# Altium footprint library SAMTEC SMD.PcbLib: 165 footprints (part 15 of 17)
Each footprint in its own frame and in the unit in brackets; x right, y up, seen from the top. Pads: shape width x height; smd on the part's side, far side on the other; paste and mask are expansions set on the pad; w line width, h text height; cw(c..) or ccw(c..) is an arc to the next point about the centre after c.
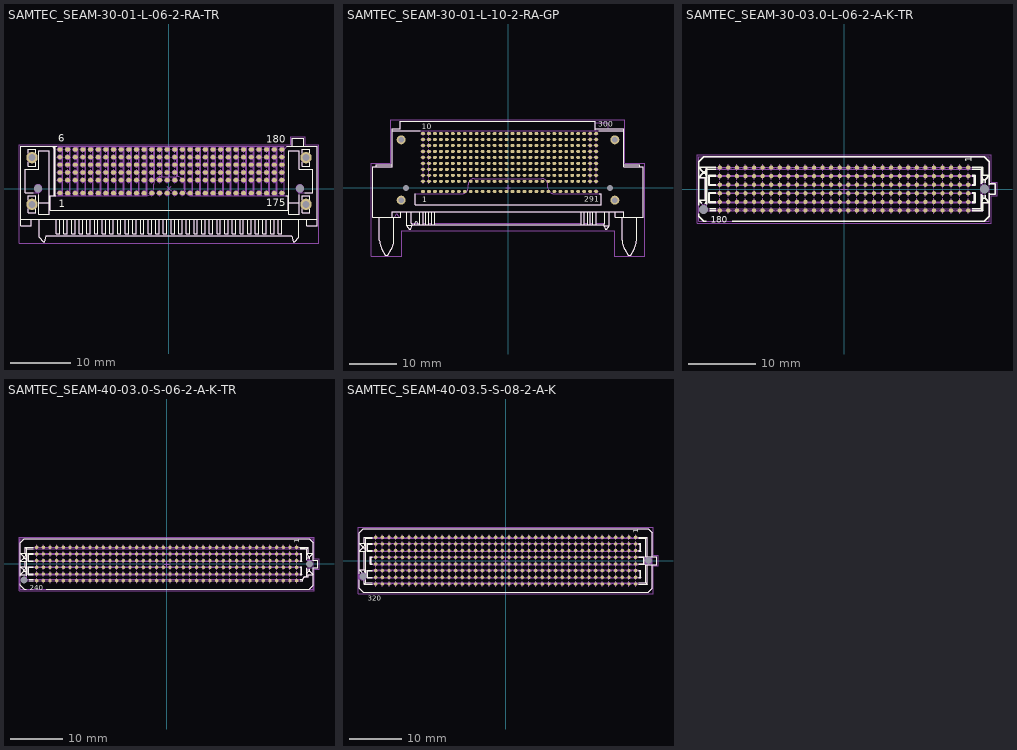
[diagram p14: the footprints below, top view; thin cyan lines are the x and y axes]

## SAMTEC_SEAM-30-01-L-06-2-RA-TR [mm] "180 Contacts in 6 rows  (30 Pin per Row), Hi-Density Right Angle Open Pin Field Connector"
height 10.59
pads (186):
  rrect100% 0.84x0.64 smd paste+0.1: 1(-18.085,-0.762) 2(-18.085,1.397) 3(-18.085,2.667) 4(-18.085,3.937) 5(-18.085,5.207) 6(-18.085,6.477) 7(-16.815,-0.762) 8(-16.815,1.397) 9(-16.815,2.667) 10(-16.815,3.937) 11(-16.815,5.207) 12(-16.815,6.477) 13(-15.545,-0.762) 14(-15.545,1.397) 15(-15.545,2.667) 16(-15.545,3.937) 17(-15.545,5.207) 18(-15.545,6.477) 19(-14.275,-0.762) 20(-14.275,1.397) 21(-14.275,2.667) 22(-14.275,3.937) 23(-14.275,5.207) 24(-14.275,6.477) 25(-13.005,-0.762) 26(-13.005,1.397) 27(-13.005,2.667) 28(-13.005,3.937) 29(-13.005,5.207) 30(-13.005,6.477) 31(-11.735,-0.762) 32(-11.735,1.397) 33(-11.735,2.667) 34(-11.735,3.937) 35(-11.735,5.207) 36(-11.735,6.477) 37(-10.465,-0.762) 38(-10.465,1.397) 39(-10.465,2.667) 40(-10.465,3.937) 41(-10.465,5.207) 42(-10.465,6.477) 43(-9.195,-0.762) 44(-9.195,1.397) 45(-9.195,2.667) 46(-9.195,3.937) 47(-9.195,5.207) 48(-9.195,6.477) 49(-7.925,-0.762) 50(-7.925,1.397) 51(-7.925,2.667) 52(-7.925,3.937) 53(-7.925,5.207) 54(-7.925,6.477) 55(-6.655,-0.762) 56(-6.655,1.397) 57(-6.655,2.667) 58(-6.655,3.937) 59(-6.655,5.207) 60(-6.655,6.477) 61(-5.385,-0.762) 62(-5.385,1.397) 63(-5.385,2.667) 64(-5.385,3.937) 65(-5.385,5.207) 66(-5.385,6.477) 67(-4.115,-0.762) 68(-4.115,1.397) 69(-4.115,2.667) 70(-4.115,3.937) 71(-4.115,5.207) 72(-4.115,6.477) 73(-2.845,-0.762) 74(-2.845,1.397) 75(-2.845,2.667) 76(-2.845,3.937) 77(-2.845,5.207) 78(-2.845,6.477) 79(-1.575,-0.762) 80(-1.575,1.397) 81(-1.575,2.667) 82(-1.575,3.937) 83(-1.575,5.207) 84(-1.575,6.477) 85(-0.305,-0.762) 86(-0.305,1.397) 87(-0.305,2.667) 88(-0.305,3.937) 89(-0.305,5.207) 90(-0.305,6.477) 91(0.965,-0.762) 92(0.965,1.397) 93(0.965,2.667) 94(0.965,3.937) 95(0.965,5.207) 96(0.965,6.477) 97(2.235,-0.762) 98(2.235,1.397) 99(2.235,2.667) 100(2.235,3.937) 101(2.235,5.207) 102(2.235,6.477) 103(3.505,-0.762) 104(3.505,1.397) 105(3.505,2.667) 106(3.505,3.937) 107(3.505,5.207) 108(3.505,6.477) 109(4.775,-0.762) 110(4.775,1.397) 111(4.775,2.667) 112(4.775,3.937) 113(4.775,5.207) 114(4.775,6.477) 115(6.045,-0.762) 116(6.045,1.397) 117(6.045,2.667) 118(6.045,3.937) 119(6.045,5.207) 120(6.045,6.477) 121(7.315,-0.762) 122(7.315,1.397) 123(7.315,2.667) 124(7.315,3.937) 125(7.315,5.207) 126(7.315,6.477) 127(8.585,-0.762) 128(8.585,1.397) 129(8.585,2.667) 130(8.585,3.937) 131(8.585,5.207) 132(8.585,6.477) 133(9.855,-0.762) 134(9.855,1.397) 135(9.855,2.667) 136(9.855,3.937) 137(9.855,5.207) 138(9.855,6.477) 139(11.125,-0.762) 140(11.125,1.397) 141(11.125,2.667) 142(11.125,3.937) 143(11.125,5.207) 144(11.125,6.477) 145(12.395,-0.762) 146(12.395,1.397) 147(12.395,2.667) 148(12.395,3.937) 149(12.395,5.207) 150(12.395,6.477) 151(13.665,-0.762) 152(13.665,1.397) 153(13.665,2.667) 154(13.665,3.937) 155(13.665,5.207) 156(13.665,6.477) 157(14.935,-0.762) 158(14.935,1.397) 159(14.935,2.667) 160(14.935,3.937) 161(14.935,5.207) 162(14.935,6.477) 163(16.205,-0.762) 164(16.205,1.397) 165(16.205,2.667) 166(16.205,3.937) 167(16.205,5.207) 168(16.205,6.477) 169(17.475,-0.762) 170(17.475,1.397) 171(17.475,2.667) 172(17.475,3.937) 173(17.475,5.207) 174(17.475,6.477) 175(18.745,-0.762) 176(18.745,1.397) 177(18.745,2.667) 178(18.745,3.937) 179(18.745,5.207) 180(18.745,6.477)
  round 0.5 hole 1.3 unplated mask+0.4: MEC1(-21.715,0) MEC2(21.715,0)
  round 1.9 hole 1.15 unplated mask+0.075: MEC3(-22.735,5.134) MEC4(-22.735,-2.616) MEC5(22.735,5.134) MEC6(22.735,-2.616)
Top Overlay:
  drawing of 197 lines, arcs and shapes, not listed
  text "6" at -18.353,7.72 h1.2
  text "180" at 16.177,7.62 h1.2
  text "175" at 16.177,-2.98 h1.2
  text "1" at -18.253,-3.08 h1.2
Mechanical 8:
  drawing of 1656 lines, arcs and shapes, not listed
Mechanical 14:
  drawing of 286 lines, arcs and shapes, not listed
  text "6" at -18.353,7.72 h1.2
  text "180" at 16.177,7.62 h1.2
  text "175" at 16.177,-2.98 h1.2
  text "1" at -18.253,-3.08 h1.2
Mechanical 15:
  lines w0.05: -24.888,-9.077 24.888,-9.077 24.888,7.298 22.529,7.298 22.484,8.568 20.238,8.568 20.194,7.298 -24.888,7.298 -24.888,-9.077
3D body "SAMTEC_SEAM-30-01-L-06-2-RA-TR.stp": height 10.57, standoff -1.51, extent -24.638,-8.826 24.638,8.319

## SAMTEC_SEAM-30-01-L-10-2-RA-GP [mm] "300 contacts (10 rows x 30 Columns) Hi-Density Right Angle Open Pin Field Connector with Guide Post Holes"
height 15.53
pads (306):
  rrect100% 0.84x0.64 smd paste+0.1: 1(-18.085,-0.762) 2(-18.085,1.397) 3(-18.085,2.667) 4(-18.085,3.937) 5(-18.085,5.207) 6(-18.085,6.477) 7(-18.085,7.747) 8(-18.085,9.017) 9(-18.085,10.287) 10(-18.085,11.557) 11(-16.815,-0.762) 12(-16.815,1.397) 13(-16.815,2.667) 14(-16.815,3.937) 15(-16.815,5.207) 16(-16.815,6.477) 17(-16.815,7.747) 18(-16.815,9.017) 19(-16.815,10.287) 20(-16.815,11.557) 21(-15.545,-0.762) 22(-15.545,1.397) 23(-15.545,2.667) 24(-15.545,3.937) 25(-15.545,5.207) 26(-15.545,6.477) 27(-15.545,7.747) 28(-15.545,9.017) 29(-15.545,10.287) 30(-15.545,11.557) 31(-14.275,-0.762) 32(-14.275,1.397) 33(-14.275,2.667) 34(-14.275,3.937) 35(-14.275,5.207) 36(-14.275,6.477) 37(-14.275,7.747) 38(-14.275,9.017) 39(-14.275,10.287) 40(-14.275,11.557) 41(-13.005,-0.762) 42(-13.005,1.397) 43(-13.005,2.667) 44(-13.005,3.937) 45(-13.005,5.207) 46(-13.005,6.477) 47(-13.005,7.747) 48(-13.005,9.017) 49(-13.005,10.287) 50(-13.005,11.557) 51(-11.735,-0.762) 52(-11.735,1.397) 53(-11.735,2.667) 54(-11.735,3.937) 55(-11.735,5.207) 56(-11.735,6.477) 57(-11.735,7.747) 58(-11.735,9.017) 59(-11.735,10.287) 60(-11.735,11.557) 61(-10.465,-0.762) 62(-10.465,1.397) 63(-10.465,2.667) 64(-10.465,3.937) 65(-10.465,5.207) 66(-10.465,6.477) 67(-10.465,7.747) 68(-10.465,9.017) 69(-10.465,10.287) 70(-10.465,11.557) 71(-9.195,-0.762) 72(-9.195,1.397) 73(-9.195,2.667) 74(-9.195,3.937) 75(-9.195,5.207) 76(-9.195,6.477) 77(-9.195,7.747) 78(-9.195,9.017) 79(-9.195,10.287) 80(-9.195,11.557) 81(-7.925,-0.762) 82(-7.925,1.397) 83(-7.925,2.667) 84(-7.925,3.937) 85(-7.925,5.207) 86(-7.925,6.477) 87(-7.925,7.747) 88(-7.925,9.017) 89(-7.925,10.287) 90(-7.925,11.557) 91(-6.655,-0.762) 92(-6.655,1.397) 93(-6.655,2.667) 94(-6.655,3.937) 95(-6.655,5.207) 96(-6.655,6.477) 97(-6.655,7.747) 98(-6.655,9.017) 99(-6.655,10.287) 100(-6.655,11.557) 101(-5.385,-0.762) 102(-5.385,1.397) 103(-5.385,2.667) 104(-5.385,3.937) 105(-5.385,5.207) 106(-5.385,6.477) 107(-5.385,7.747) 108(-5.385,9.017) 109(-5.385,10.287) 110(-5.385,11.557) 111(-4.115,-0.762) 112(-4.115,1.397) 113(-4.115,2.667) 114(-4.115,3.937) 115(-4.115,5.207) 116(-4.115,6.477) 117(-4.115,7.747) 118(-4.115,9.017) 119(-4.115,10.287) 120(-4.115,11.557) 121(-2.845,-0.762) 122(-2.845,1.397) 123(-2.845,2.667) 124(-2.845,3.937) 125(-2.845,5.207) 126(-2.845,6.477) 127(-2.845,7.747) 128(-2.845,9.017) 129(-2.845,10.287) 130(-2.845,11.557) 131(-1.575,-0.762) 132(-1.575,1.397) 133(-1.575,2.667) 134(-1.575,3.937) 135(-1.575,5.207) 136(-1.575,6.477) 137(-1.575,7.747) 138(-1.575,9.017) 139(-1.575,10.287) 140(-1.575,11.557) 141(-0.305,-0.762) 142(-0.305,1.397) 143(-0.305,2.667) 144(-0.305,3.937) 145(-0.305,5.207) 146(-0.305,6.477) 147(-0.305,7.747) 148(-0.305,9.017) 149(-0.305,10.287) 150(-0.305,11.557) 151(0.965,-0.762) 152(0.965,1.397) 153(0.965,2.667) 154(0.965,3.937) 155(0.965,5.207) 156(0.965,6.477) 157(0.965,7.747) 158(0.965,9.017) 159(0.965,10.287) 160(0.965,11.557) 161(2.235,-0.762) 162(2.235,1.397) 163(2.235,2.667) 164(2.235,3.937) 165(2.235,5.207) 166(2.235,6.477) 167(2.235,7.747) 168(2.235,9.017) 169(2.235,10.287) 170(2.235,11.557) 171(3.505,-0.762) 172(3.505,1.397) 173(3.505,2.667) 174(3.505,3.937) 175(3.505,5.207) 176(3.505,6.477) 177(3.505,7.747) 178(3.505,9.017) 179(3.505,10.287) 180(3.505,11.557) 181(4.775,-0.762) 182(4.775,1.397) 183(4.775,2.667) 184(4.775,3.937) 185(4.775,5.207) 186(4.775,6.477) 187(4.775,7.747) 188(4.775,9.017) 189(4.775,10.287) 190(4.775,11.557) 191(6.045,-0.762) 192(6.045,1.397) 193(6.045,2.667) 194(6.045,3.937) 195(6.045,5.207) 196(6.045,6.477) 197(6.045,7.747) 198(6.045,9.017) 199(6.045,10.287) 200(6.045,11.557) 201(7.315,-0.762) 202(7.315,1.397) 203(7.315,2.667) 204(7.315,3.937) 205(7.315,5.207) 206(7.315,6.477) 207(7.315,7.747) 208(7.315,9.017) 209(7.315,10.287) 210(7.315,11.557) 211(8.585,-0.762) 212(8.585,1.397) 213(8.585,2.667) 214(8.585,3.937) 215(8.585,5.207) 216(8.585,6.477) 217(8.585,7.747) 218(8.585,9.017) 219(8.585,10.287) 220(8.585,11.557) 221(9.855,-0.762) 222(9.855,1.397) 223(9.855,2.667) 224(9.855,3.937) 225(9.855,5.207) 226(9.855,6.477) 227(9.855,7.747) 228(9.855,9.017) 229(9.855,10.287) 230(9.855,11.557) 231(11.125,-0.762) 232(11.125,1.397) 233(11.125,2.667) 234(11.125,3.937) 235(11.125,5.207) 236(11.125,6.477) 237(11.125,7.747) 238(11.125,9.017) 239(11.125,10.287) 240(11.125,11.557) 241(12.395,-0.762) 242(12.395,1.397) 243(12.395,2.667) 244(12.395,3.937) 245(12.395,5.207) 246(12.395,6.477) 247(12.395,7.747) 248(12.395,9.017) 249(12.395,10.287) 250(12.395,11.557) 251(13.665,-0.762) 252(13.665,1.397) 253(13.665,2.667) 254(13.665,3.937) 255(13.665,5.207) 256(13.665,6.477) 257(13.665,7.747) 258(13.665,9.017) 259(13.665,10.287) 260(13.665,11.557) 261(14.935,-0.762) 262(14.935,1.397) 263(14.935,2.667) 264(14.935,3.937) 265(14.935,5.207) 266(14.935,6.477) 267(14.935,7.747) 268(14.935,9.017) 269(14.935,10.287) 270(14.935,11.557) 271(16.205,-0.762) 272(16.205,1.397) 273(16.205,2.667) 274(16.205,3.937) 275(16.205,5.207) 276(16.205,6.477) 277(16.205,7.747) 278(16.205,9.017) 279(16.205,10.287) 280(16.205,11.557) 281(17.475,-0.762) 282(17.475,1.397) 283(17.475,2.667) 284(17.475,3.937) 285(17.475,5.207) 286(17.475,6.477) 287(17.475,7.747) 288(17.475,9.017) 289(17.475,10.287) 290(17.475,11.557) 291(18.745,-0.762) 292(18.745,1.397) 293(18.745,2.667) 294(18.745,3.937) 295(18.745,5.207) 296(18.745,6.477) 297(18.745,7.747) 298(18.745,9.017) 299(18.745,10.287) 300(18.745,11.557)
  round 0.5 hole 1.3 unplated mask+0.4: MEC1(-21.715,0) MEC2(21.715,0)
  round 1.9 hole 1.15 unplated mask+0.075: MEC3(-22.735,10.214) MEC4(-22.735,-2.616) MEC5(22.735,10.214) MEC6(22.735,-2.616)
Top Overlay:
  lines w0.2: -28.003,4.496 -28.003,4.953 -24.638,4.953 ; -27.343,-6.223 -27.343,-11.129 ccw(c-23.533,-11.129) -26.833,-13.033 ; -26.833,-13.033 -26.073,-14.351 -25.565,-14.351 -24.805,-13.033 ; -24.805,-13.033 ccw(c-28.105,-11.129) -24.295,-11.129 -24.295,-6.223 ; -24.638,-6.223 -24.638,-5.08 24.638,-5.08 24.638,-6.223 ; -24.638,12.116 -18.657,12.116 ; -22.86,-5.08 -22.86,-6.223 -28.829,-6.223 -28.829,4.496 -24.638,4.496 -24.638,12.624 -22.911,12.624 -22.911,14.199 18.517,14.199 18.517,12.324 ; -21.539,-7.968 -20.352,-7.968 -20.669,-8.839 -21.006,-8.839 -21.539,-8.077 -21.539,-5.08 ; -20.599,-5.08 -20.599,-7.569 -20.345,-7.823 ; -20.345,-7.95 -20.345,-7.823 ; -19.95,-7.823 -19.5,-7.123 -19.05,-7.823 ; -19.685,-1.219 -19.685,-3.632 19.812,-3.632 19.812,-1.219 19.401,-1.219 ; -18.745,-7.823 -18.745,-5.08 ; -18.085,-7.823 -18.085,-5.08 ; -17.475,-7.823 -17.475,-5.08 ; -16.815,-7.823 -16.815,-5.08 ; -16.205,-7.823 -16.205,-5.08 ; -15.545,-7.823 -15.545,-5.08 ; 15.545,-7.823 15.545,-5.08 ; 16.205,-7.823 16.205,-5.08 ; 16.815,-7.823 16.815,-5.08 ; 17.475,-7.823 17.475,-5.08 ; 18.085,-7.823 18.085,-5.08 ; 18.517,12.548 24.638,12.548 24.638,4.496 28.829,4.496 28.829,-6.223 22.86,-6.223 22.86,-5.08 ; 18.745,-7.823 18.745,-5.08 ; 19.317,12.116 24.638,12.116 ; 20.392,-8.077 21.539,-8.077 ; 20.599,-5.08 20.599,-7.569 20.345,-7.823 ; 21.539,-5.08 21.539,-8.077 ; 24.295,-6.223 24.295,-11.129 ccw(c28.105,-11.129) 24.805,-13.033 ; 24.638,4.953 28.003,4.953 28.003,4.496 ; 24.805,-13.033 25.565,-14.351 26.073,-14.351 26.833,-13.033 ; 26.833,-13.033 ccw(c23.533,-11.129) 27.343,-11.129 27.343,-6.223 ; -20.345,-7.823 20.345,-7.823 ; 20.345,-7.823 20.345,-7.95 20.669,-8.839 21.006,-8.839 21.539,-8.077
  text "1" at -18.253,-3.08 h1.2
  text "291" at 16.177,-2.98 h1.2
  text "300" at 19.209,13.018 h1.2
  text "10" at -18.353,12.482 h1.2
Mechanical 8:
  drawing of 176 lines, arcs and shapes, not listed
Mechanical 14:
  lines w0.1: -28.003,4.496 -28.003,4.953 -24.638,4.953 ; -27.343,-6.223 -27.343,-11.129 ccw(c-23.533,-11.129) -26.833,-13.033 ; -26.833,-13.033 -26.073,-14.351 -25.565,-14.351 -24.805,-13.033 ; -24.805,-13.033 ccw(c-28.105,-11.129) -24.295,-11.129 -24.295,-6.223 ; -24.638,-6.223 -24.638,-5.08 24.638,-5.08 24.638,-6.223 ; -24.638,12.116 24.638,12.116 ; -24.072,-6.223 -23.622,-5.523 -23.172,-6.223 ; -22.86,-5.08 -22.86,-6.223 -28.829,-6.223 -28.829,4.496 -24.638,4.496 -24.638,12.624 -22.911,12.624 -22.911,14.199 18.517,14.199 18.517,12.116 ; -21.539,-7.968 -20.352,-7.968 -20.669,-8.839 -21.006,-8.839 -21.539,-8.077 -21.539,-5.08 ; -20.599,-5.08 -20.599,-7.569 ; -20.345,-7.95 -20.345,-7.823 ; -18.745,-7.823 -18.745,-5.08 ; -18.745,-7.569 -20.599,-7.569 ; -18.085,-7.823 -18.085,-5.08 ; -18.085,-7.569 -17.475,-7.569 ; -17.475,-7.823 -17.475,-5.08 ; -16.815,-7.823 -16.815,-5.08 ; -16.815,-7.569 -16.205,-7.569 ; -16.205,-7.823 -16.205,-5.08 ; -15.545,-7.823 -15.545,-5.08 ; -15.545,-7.569 15.545,-7.569 ; 15.545,-7.823 15.545,-5.08 ; 16.205,-7.823 16.205,-5.08 ; 16.205,-7.569 16.815,-7.569 ; 16.815,-7.823 16.815,-5.08 ; 17.475,-7.823 17.475,-5.08 ; 17.475,-7.569 18.085,-7.569 ; 18.085,-7.823 18.085,-5.08 ; 18.517,12.548 24.638,12.548 24.638,4.496 28.829,4.496 28.829,-6.223 22.86,-6.223 22.86,-5.08 ; 18.517,13.818 21.311,13.818 21.311,12.548 ; 18.745,-7.823 18.745,-5.08 ; 18.745,-7.569 20.599,-7.569 ; 20.392,-8.077 21.539,-8.077 ; 20.599,-5.08 20.599,-7.569 ; 21.539,-5.08 21.539,-8.077 ; 24.295,-6.223 24.295,-11.129 ccw(c28.105,-11.129) 24.805,-13.033 ; 24.638,4.953 28.003,4.953 28.003,4.496 ; 24.805,-13.033 25.565,-14.351 26.073,-14.351 26.833,-13.033 ; 26.833,-13.033 ccw(c23.533,-11.129) 27.343,-11.129 27.343,-6.223 ; -20.599,-7.569 -20.345,-7.823 ; -20.345,-7.823 20.345,-7.823 ; 20.345,-7.823 20.345,-7.95 20.669,-8.839 21.006,-8.839 21.539,-8.077 ; 20.345,-7.823 20.599,-7.569 ; -19.685,-3.632 19.812,-3.632 19.812,-1.219 9.741,-1.219 cw(c9.741,0.051) 8.471,0.051 8.471,0.686 ccw(c7.201,0.686) 7.201,1.956 -7.201,1.956 ccw(c-7.201,0.686) -8.471,0.686 -8.471,0.051 cw(c-9.741,0.051) -9.741,-1.219 -19.685,-1.219 -19.685,-3.632
  text "1" at -18.253,-3.08 h1.2
  text "291" at 16.177,-2.98 h1.2
  text "300" at 19.209,13.018 h1.2
  text "10" at -18.353,12.482 h1.2
Mechanical 15:
  lines w0.05: -29.079,-14.601 -22.559,-14.601 -22.559,-9.089 22.559,-9.089 22.559,-14.601 29.079,-14.601 29.079,-14.351 29.079,5.203 24.888,5.203 24.888,14.449 -24.938,14.449 -24.938,5.203 -29.079,5.203 -29.079,-14.601
3D body "SAMTEC_SEAM-30-01-L-10-2-RA-GP.stp": height 15.65, standoff -1.5, extent -28.829,-14.351 28.829,14.199

## SAMTEC_SEAM-30-03.0-L-06-2-A-K-TR [mm] "PISMO 2, VITA 57, VITA 57 Standard, 6 rows x 30 Columns, 180 contacts Male Connector"
height 6.6
pads (182):
  round 0.64 smd paste+0.125: 1(18.415,3.175) 2(18.415,1.905) 3(18.415,0.635) 4(18.415,-0.635) 5(18.415,-1.905) 6(18.415,-3.175) 7(17.145,3.175) 8(17.145,1.905) 9(17.145,0.635) 10(17.145,-0.635) 11(17.145,-1.905) 12(17.145,-3.175) 13(15.875,3.175) 14(15.875,1.905) 15(15.875,0.635) 16(15.875,-0.635) 17(15.875,-1.905) 18(15.875,-3.175) 19(14.605,3.175) 20(14.605,1.905) 21(14.605,0.635) 22(14.605,-0.635) 23(14.605,-1.905) 24(14.605,-3.175) 25(13.335,3.175) 26(13.335,1.905) 27(13.335,0.635) 28(13.335,-0.635) 29(13.335,-1.905) 30(13.335,-3.175) 31(12.065,3.175) 32(12.065,1.905) 33(12.065,0.635) 34(12.065,-0.635) 35(12.065,-1.905) 36(12.065,-3.175) 37(10.795,3.175) 38(10.795,1.905) 39(10.795,0.635) 40(10.795,-0.635) 41(10.795,-1.905) 42(10.795,-3.175) 43(9.525,3.175) 44(9.525,1.905) 45(9.525,0.635) 46(9.525,-0.635) 47(9.525,-1.905) 48(9.525,-3.175) 49(8.255,3.175) 50(8.255,1.905) 51(8.255,0.635) 52(8.255,-0.635) 53(8.255,-1.905) 54(8.255,-3.175) 55(6.985,3.175) 56(6.985,1.905) 57(6.985,0.635) 58(6.985,-0.635) 59(6.985,-1.905) 60(6.985,-3.175) 61(5.715,3.175) 62(5.715,1.905) 63(5.715,0.635) 64(5.715,-0.635) 65(5.715,-1.905) 66(5.715,-3.175) 67(4.445,3.175) 68(4.445,1.905) 69(4.445,0.635) 70(4.445,-0.635) 71(4.445,-1.905) 72(4.445,-3.175) 73(3.175,3.175) 74(3.175,1.905) 75(3.175,0.635) 76(3.175,-0.635) 77(3.175,-1.905) 78(3.175,-3.175) 79(1.905,3.175) 80(1.905,1.905) 81(1.905,0.635) 82(1.905,-0.635) 83(1.905,-1.905) 84(1.905,-3.175) 85(0.635,3.175) 86(0.635,1.905) 87(0.635,0.635) 88(0.635,-0.635) 89(0.635,-1.905) 90(0.635,-3.175) 91(-0.635,3.175) 92(-0.635,1.905) 93(-0.635,0.635) 94(-0.635,-0.635) 95(-0.635,-1.905) 96(-0.635,-3.175) 97(-1.905,3.175) 98(-1.905,1.905) 99(-1.905,0.635) 100(-1.905,-0.635) 101(-1.905,-1.905) 102(-1.905,-3.175) 103(-3.175,3.175) 104(-3.175,1.905) 105(-3.175,0.635) 106(-3.175,-0.635) 107(-3.175,-1.905) 108(-3.175,-3.175) 109(-4.445,3.175) 110(-4.445,1.905) 111(-4.445,0.635) 112(-4.445,-0.635) 113(-4.445,-1.905) 114(-4.445,-3.175) 115(-5.715,3.175) 116(-5.715,1.905) 117(-5.715,0.635) 118(-5.715,-0.635) 119(-5.715,-1.905) 120(-5.715,-3.175) 121(-6.985,3.175) 122(-6.985,1.905) 123(-6.985,0.635) 124(-6.985,-0.635) 125(-6.985,-1.905) 126(-6.985,-3.175) 127(-8.255,3.175) 128(-8.255,1.905) 129(-8.255,0.635) 130(-8.255,-0.635) 131(-8.255,-1.905) 132(-8.255,-3.175) 133(-9.525,3.175) 134(-9.525,1.905) 135(-9.525,0.635) 136(-9.525,-0.635) 137(-9.525,-1.905) 138(-9.525,-3.175) 139(-10.795,3.175) 140(-10.795,1.905) 141(-10.795,0.635) 142(-10.795,-0.635) 143(-10.795,-1.905) 144(-10.795,-3.175) 145(-12.065,3.175) 146(-12.065,1.905) 147(-12.065,0.635) 148(-12.065,-0.635) 149(-12.065,-1.905) 150(-12.065,-3.175) 151(-13.335,3.175) 152(-13.335,1.905) 153(-13.335,0.635) 154(-13.335,-0.635) 155(-13.335,-1.905) 156(-13.335,-3.175) 157(-14.605,3.175) 158(-14.605,1.905) 159(-14.605,0.635) 160(-14.605,-0.635) 161(-14.605,-1.905) 162(-14.605,-3.175) 163(-15.875,3.175) 164(-15.875,1.905) 165(-15.875,0.635) 166(-15.875,-0.635) 167(-15.875,-1.905) 168(-15.875,-3.175) 169(-17.145,3.175) 170(-17.145,1.905) 171(-17.145,0.635) 172(-17.145,-0.635) 173(-17.145,-1.905) 174(-17.145,-3.175) 175(-18.415,3.175) 176(-18.415,1.905) 177(-18.415,0.635) 178(-18.415,-0.635) 179(-18.415,-1.905) 180(-18.415,-3.175)
  round 0.5 hole 1.3 unplated mask+0.4: MEC1(-20.841,-3.05) MEC2(20.839,0)
Top Overlay:
  lines w0.2: -21.539,-3.672 -21.539,-4.039 -20.777,-4.801 -20.451,-4.801 ; -21.539,-2.428 -21.539,4.039 -20.777,4.801 20.777,4.801 21.539,4.039 21.539,0.62 ; -21.072,-2.144 -21.539,-1.676 -20.345,-1.676 ; -20.599,-1.676 -20.599,1.676 ; -20.548,-2.162 -20.382,-1.676 ; -20.382,1.676 -20.599,2.311 ; -20.382,3.2 -20.599,2.565 ; -20.345,-2.257 -20.345,3.2 ; -20.345,1.676 -21.539,1.676 -20.904,2.311 ; -20.345,2.946 -19.035,2.946 ; -19.918,-3.2 -19.035,-3.2 ; -19.912,-2.946 -19.035,-2.946 ; -19.035,-2.007 -20.066,-2.007 ; -19.035,-1.88 -19.939,-1.88 ; -19.035,-0.66 -19.939,-0.66 ; -19.035,-0.533 -20.066,-0.533 ; -19.035,0.533 -20.066,0.533 ; -19.035,0.66 -19.939,0.66 ; -19.035,1.88 -19.939,1.88 ; -19.035,2.007 -20.066,2.007 ; -19.035,3.2 -21.539,3.2 -20.904,2.565 ; -16.549,-4.801 20.777,-4.801 21.539,-4.039 21.539,-0.62 ; 19.035,-3.2 20.599,-3.2 ; 19.035,-2.946 20.345,-2.946 ; 19.035,-2.007 19.431,-2.007 ; 19.035,-1.88 19.304,-1.88 ; 19.035,-0.66 19.304,-0.66 ; 19.035,-0.533 19.431,-0.533 ; 19.035,0.533 19.431,0.533 ; 19.035,0.66 19.304,0.66 ; 19.035,1.88 19.304,1.88 ; 19.035,2.007 19.431,2.007 ; 19.035,2.946 20.345,2.946 ; 19.035,3.2 20.599,3.2 ; 20.345,-2.007 21.539,-2.007 20.904,-1.372 ; 20.345,-0.794 20.345,-2.946 ; 20.345,0.794 20.345,2.946 ; 20.345,2.007 21.539,2.007 20.904,1.372 ; 20.382,-2.007 20.599,-1.372 ; 20.382,2.007 20.599,1.372 ; 20.599,-2.007 20.599,-3.2 ; 20.599,-0.904 20.599,-1.372 ; 20.599,0.904 20.599,1.372 ; 20.599,2.007 20.599,3.2 ; 20.904,-0.933 20.904,-1.372 ; 20.904,0.933 20.904,1.372 ; 21.539,0.762 22.428,0.762 22.428,-0.762 21.54,-0.762 ; -20.904,2.311 -20.904,2.565 ; -20.904,2.311 -20.599,2.311 ; -20.904,2.565 -20.599,2.565 ; -20.599,2.311 -20.599,2.565 ; -20.066,-2.007 -19.939,-1.88 ; -20.066,-2.007 -20.066,-0.533 ; -20.066,-0.533 -19.939,-0.66 ; -20.066,0.533 -19.939,0.66 ; -20.066,0.533 -20.066,2.007 ; -20.066,2.007 -19.939,1.88 ; -19.939,-1.88 -19.939,-0.66 ; -19.939,0.66 -19.939,1.88 ; 19.304,-1.88 19.304,-0.66 ; 19.304,-1.88 19.431,-2.007 ; 19.304,-0.66 19.431,-0.533 ; 19.304,0.66 19.431,0.533 ; 19.304,0.66 19.304,1.88 ; 19.304,1.88 19.431,2.007 ; 19.431,-2.007 19.431,-0.533 ; 19.431,0.533 19.431,2.007 ; 20.345,-2.946 20.599,-3.2 ; 20.345,2.946 20.599,3.2 ; 20.599,-1.372 20.904,-1.372 ; 20.599,1.372 20.904,1.372
  text "180" at -19.74,-4.969 h1
  text "1" at 18.919,3.935 h1
Mechanical 8:
  drawing of 739 lines, arcs and shapes, not listed
Mechanical 14:
  lines w0.1: -20.599,-1.676 -20.599,1.676 ; -20.451,-4.801 -20.777,-4.801 -21.539,-4.039 -21.539,4.039 -20.777,4.801 20.777,4.801 21.539,4.039 21.539,-4.039 20.777,-4.801 -16.549,-4.801 ; -20.382,-3.2 -20.599,-2.565 ; -20.382,-1.676 -20.599,-2.311 ; -20.382,1.676 -20.599,2.311 ; -20.382,3.2 -20.599,2.565 ; -20.345,-3.2 -20.345,3.2 ; -20.345,-2.946 20.345,-2.946 ; -20.345,-1.676 -21.539,-1.676 -20.904,-2.311 ; -20.345,1.676 -21.539,1.676 -20.904,2.311 ; -20.345,2.946 20.345,2.946 ; -18.694,-3.2 -18.694,-3.251 -18.136,-3.251 -18.136,-3.2 ; -18.694,-1.88 -18.694,-1.829 -18.136,-1.829 -18.136,-1.88 ; -18.694,-0.66 -18.694,-0.711 -18.136,-0.711 -18.136,-0.66 ; -18.694,0.66 -18.694,0.711 -18.136,0.711 -18.136,0.66 ; -18.694,1.88 -18.694,1.829 -18.136,1.829 -18.136,1.88 ; -18.694,3.2 -18.694,3.251 -18.136,3.251 -18.136,3.2 ; 18.136,-3.2 18.136,-3.251 18.694,-3.251 18.694,-3.2 ; 18.136,-1.88 18.136,-1.829 18.694,-1.829 18.694,-1.88 ; 18.136,-0.66 18.136,-0.711 18.694,-0.711 18.694,-0.66 ; 18.136,0.66 18.136,0.711 18.694,0.711 18.694,0.66 ; 18.136,1.88 18.136,1.829 18.694,1.829 18.694,1.88 ; 18.136,3.2 18.136,3.251 18.694,3.251 18.694,3.2 ; 20.345,-2.007 21.539,-2.007 20.904,-1.372 ; 20.345,2.007 21.539,2.007 20.904,1.372 ; 20.382,-2.007 20.599,-1.372 ; 20.382,2.007 20.599,1.372 ; 20.599,-2.007 20.599,-3.2 ; 20.599,2.007 20.599,3.2 ; 21.539,0.762 22.428,0.762 22.428,-0.762 21.54,-0.762 ; -20.904,-2.565 -21.539,-3.2 20.599,-3.2 ; -20.904,-2.565 -20.599,-2.565 ; -20.904,-2.565 -20.904,-2.311 ; -20.904,-2.311 -20.599,-2.311 ; -20.904,2.311 -20.904,2.565 ; -20.904,2.311 -20.599,2.311 ; -20.904,2.565 -20.599,2.565 ; -20.904,2.565 -21.539,3.2 20.599,3.2 ; -20.599,-2.565 -20.599,-2.311 ; -20.599,2.311 -20.599,2.565 ; -20.066,-2.007 -19.939,-1.88 ; -20.066,-2.007 -20.066,-0.533 ; -20.066,-2.007 19.431,-2.007 ; -20.066,-0.533 -19.939,-0.66 ; -20.066,-0.533 19.431,-0.533 ; -20.066,0.533 -19.939,0.66 ; -20.066,0.533 -20.066,2.007 ; -20.066,0.533 19.431,0.533 ; -20.066,2.007 -19.939,1.88 ; -20.066,2.007 19.431,2.007 ; -19.939,-1.88 19.304,-1.88 ; -19.939,-1.88 -19.939,-0.66 ; -19.939,-0.66 19.304,-0.66 ; -19.939,0.66 -19.939,1.88 ; -19.939,0.66 19.304,0.66 ; -19.939,1.88 19.304,1.88 ; 19.304,-1.88 19.304,-0.66 ; 19.304,-1.88 19.431,-2.007 ; 19.304,-0.66 19.431,-0.533 ; 19.304,0.66 19.431,0.533 ; 19.304,0.66 19.304,1.88 ; 19.304,1.88 19.431,2.007 ; 19.431,-2.007 19.431,-0.533 ; 19.431,0.533 19.431,2.007 ; 20.345,-2.946 20.599,-3.2 ; 20.345,-2.946 20.345,2.946 ; 20.345,2.946 20.599,3.2 ; 20.599,-1.372 20.599,1.372 ; 20.599,-1.372 20.904,-1.372 ; 20.599,1.372 20.904,1.372 ; 20.904,-1.372 20.904,1.372